# Altium footprint library 1MaxPcb.PcbLib: 187 footprints (part 1 of 12)
Each footprint in its own frame and in the unit in brackets; x right, y up, seen from the top. Pads: shape width x height; smd on the part's side, far side on the other; paste and mask are expansions set on the pad; w line width, h text height; cw(c..) or ccw(c..) is an arc to the next point about the centre after c.
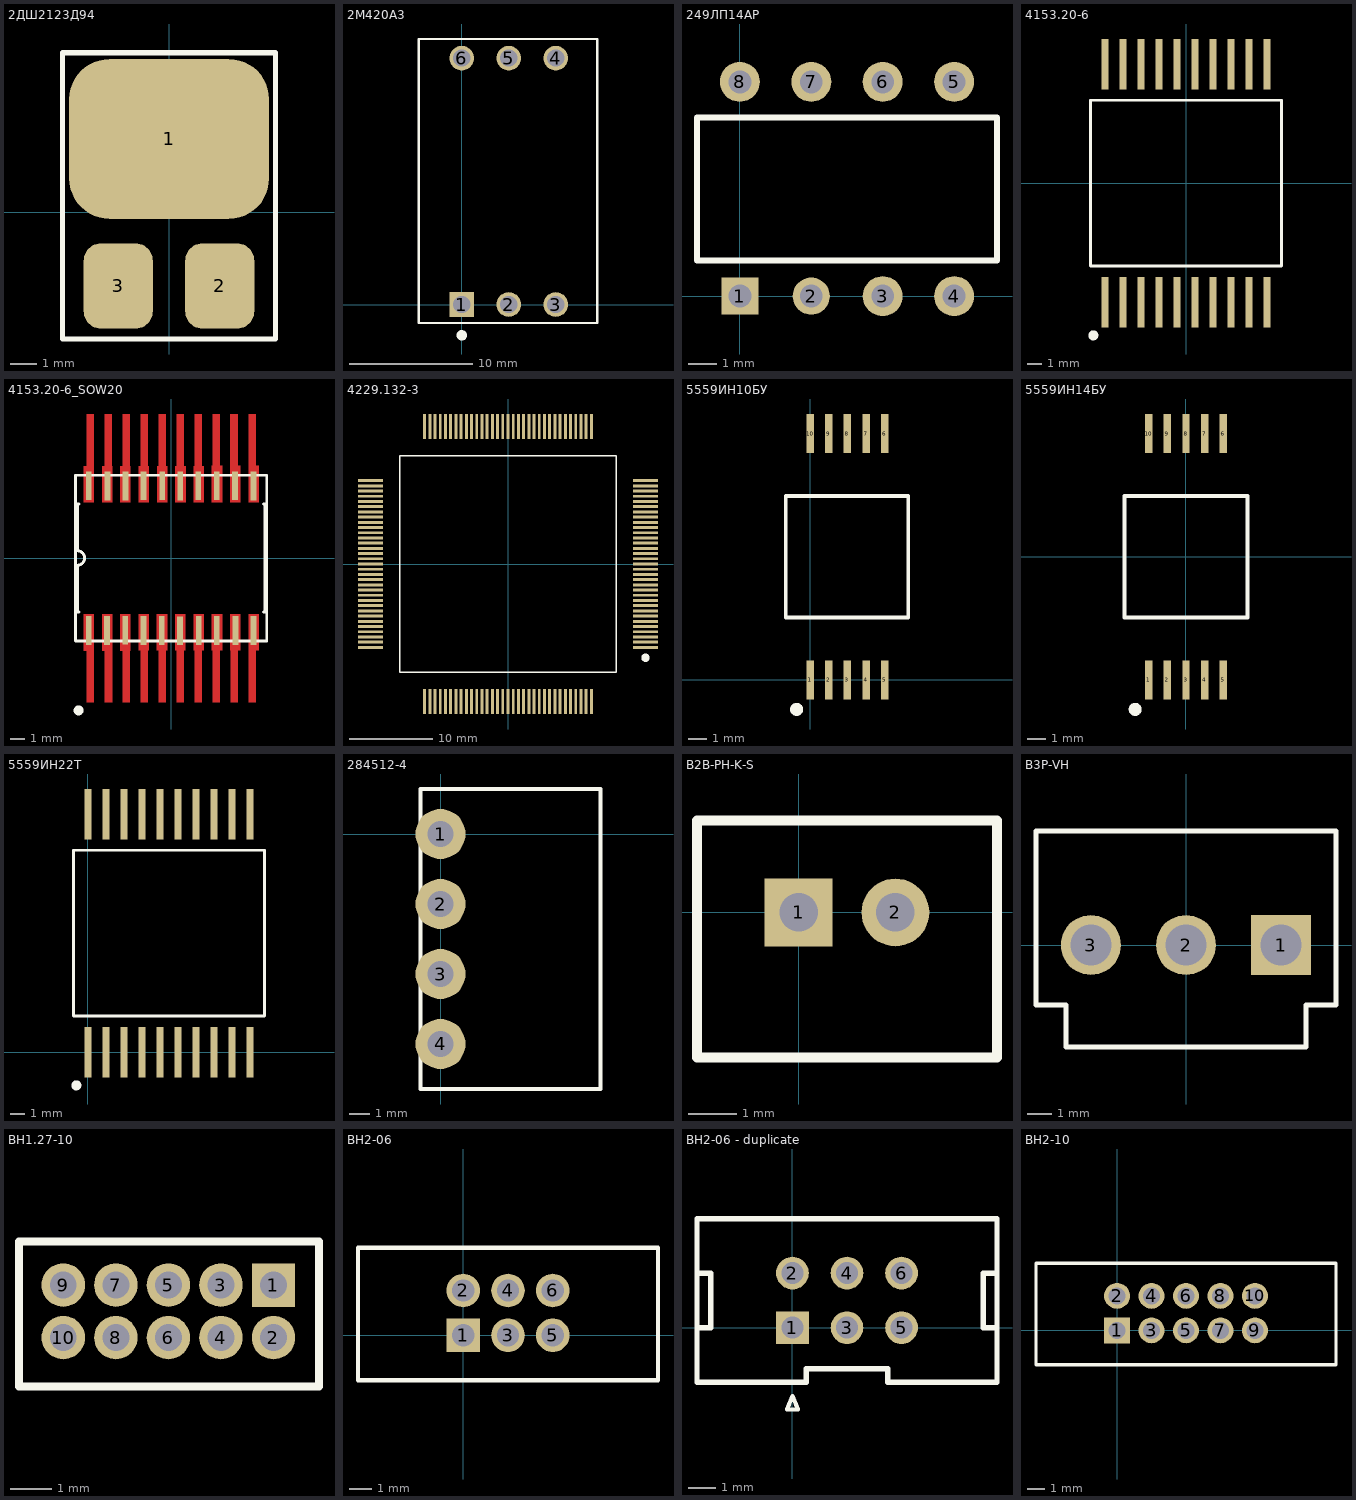
[diagram p0: the footprints below, top view; thin cyan lines are the x and y axes]

## 2ДШ2123Д94 [mm] "Диод Шоттки"
pads (3):
  rrect50% 7.5x6 smd: 1(0.005,2.76)
  rrect50% 2.6x3.2 smd: 2(1.905,-2.76) 3(-1.905,-2.76)
Top Overlay:
  lines w0.2: -4,-4.75 -4,6 4,6 4,-4.75 -4,-4.75
3D body "User Library-IR_SMD_0_5.STEP": height 3.1, standoff -0.02, extent -3.765,-4.44 3.755,5.72

## 2М420А3 [mm] "Герметичное МОП-реле 90В/5А"
pads (6):
  rect 2x2 hole 1.4: 1(0,0)
  round 2 hole 1.4: 2(3.81,0) 3(7.62,0) 4(7.62,20) 5(3.81,20) 6(0,20)
Top Overlay:
  circle w0.254: c0,-2.5 r0.3
  region: 0,-2.744 -0.051,-2.744 -0.144,-2.705 -0.215,-2.634 -0.254,-2.541 -0.254,-2.49 -0.254,-2.439 -0.215,-2.346 -0.144,-2.275 -0.051,-2.236 0,-2.236 0.051,-2.236 0.144,-2.275 0.215,-2.346 0.254,-2.439 0.254,-2.49 0.254,-2.541 0.215,-2.634 0.144,-2.705 0.051,-2.744
  lines w0.2: -3.5,-1.5 11,-1.5 11,21.55 -3.5,21.55 -3.5,-1.5
3D body "Оптореле 2М420А3.STEP": height 6.4, standoff -8.5, extent -3.05,-0.4 10.65,20.6

## 249ЛП14АР [mm] "многоканальные оптроны"
pads (8):
  rect 1.3x1.3 hole 0.8: 1(0,0)
  round 1.3 hole 0.8: 2(2.5,0)
  round 1.4 hole 0.8: 3(5,0) 4(7.5,0) 5(7.5,7.5) 6(5,7.5) 7(2.5,7.5) 8(0,7.5)
Top Overlay:
  lines w0.2: -1.5,1.25 -1.5,6.25 9,6.25 9,1.25 -1.5,1.25
3D body "User Library-2101_8-7.STEP": height 4.9, standoff -2.3, extent -1.25,-0.16 8.75,7.66

## 4153.20-6 [mm] "Регистр сдвига"
pads (20):
  rect 0.5x3.5 smd: 1(-5.625,-8.25) 2(-4.375,-8.25) 3(-3.125,-8.25) 4(-1.875,-8.25) 5(-0.625,-8.25) 6(0.625,-8.25) 7(1.875,-8.25) 8(3.125,-8.25) 9(4.375,-8.25) 10(5.625,-8.25) 11(5.625,8.25) 12(4.375,8.25) 13(3.125,8.25) 14(1.875,8.25) 15(0.625,8.25) 16(-0.625,8.25) 17(-1.875,8.25) 18(-3.125,8.25) 19(-4.375,8.25) 20(-5.625,8.25)
Top Overlay:
  circle w0.2: c-6.425,-10.55 r0.25
  rectangle: -6.625,-10.775 -6.225,-10.325
  lines w0.2: -6.625,-5.75 -6.625,5.75 6.625,5.75 6.625,-5.75 -6.625,-5.75
3D body "User Library-4153_20-6.STEP": height 3.04, standoff 0, extent -6.5,-8.8 6.5,8.7

## 4153.20-6_SOW20 [mm] "Регистр сдвига"
pads (20):
  rect 0.4x2 smd: 1(-5.725,-5) 2(-4.45,-5) 3(-3.195,-4.996) 4(-1.925,-5) 5(-0.65,-5) 6(0.6,-5.025) 7(1.9,-5) 8(3.15,-5) 9(4.45,-5) 10(5.7,-5) 11(5.7,5) 12(4.425,5.025) 13(3.15,5.025) 14(1.875,5.025) 15(0.625,5) 16(-0.625,5.025) 17(-1.925,5.025) 18(-3.175,5) 19(-4.425,5) 20(-5.725,5.025)
Top Layer:
  region: 4.1,-6.375 4.1,-3.875 4.8,-3.875 4.8,-6.375 4.625,-6.375 4.625,-10 4.125,-10 4.125,-6.375
  region: -1,-6.375 -1,-3.875 -0.275,-3.875 -0.275,-6.375 -0.375,-6.375 -0.375,-10 -0.875,-10 -0.875,-6.375
  region: -6.075,-6.4 -6.075,-3.875 -5.375,-3.875 -5.375,-10 -5.875,-10 -5.875,-6.4
  region: -4.8,-6.4 -4.8,-3.875 -4.1,-3.875 -4.1,-10 -4.625,-10 -4.625,-6.4
  region: -3.525,-6.4 -3.525,-3.875 -2.825,-3.875 -2.825,-6.4 -2.875,-6.4 -2.875,-10 -3.375,-10 -3.375,-6.4
  region: -2.25,-6.375 -2.125,-6.375 -2.125,-10 -1.625,-10 -1.625,-6.375 -1.55,-6.375 -1.55,-3.875 -2.25,-3.875
  region: 0.275,-6.375 0.275,-3.875 0.975,-3.875 0.975,-6.375 0.875,-6.375 0.875,-10 0.375,-10 0.375,-6.375
  region: 1.55,-6.375 1.625,-6.375 1.625,-10 2.125,-10 2.125,-6.375 2.25,-6.375 2.25,-3.875 1.55,-3.875
  region: 2.825,-6.375 2.825,-3.875 3.525,-3.875 3.525,-6.375 3.375,-6.375 3.375,-10 2.875,-10 2.875,-6.375
  region: 5.375,-10 5.875,-10 5.875,-6.375 6.075,-6.375 6.075,-3.875 5.375,-3.875
  region: -4.1,6.375 -4.1,3.875 -4.8,3.875 -4.8,6.375 -4.625,6.375 -4.625,10 -4.125,10 -4.125,6.375
  region: 1,6.375 1,3.875 0.275,3.875 0.275,6.375 0.375,6.375 0.375,10 0.875,10 0.875,6.375
  region: 6.075,6.4 6.075,3.875 5.375,3.875 5.375,10 5.875,10 5.875,6.4
  region: 4.8,6.4 4.8,3.875 4.1,3.875 4.1,10 4.625,10 4.625,6.4
  region: 3.525,6.4 3.525,3.875 2.825,3.875 2.825,6.4 2.875,6.4 2.875,10 3.375,10 3.375,6.4
  region: 2.25,6.375 2.125,6.375 2.125,10 1.625,10 1.625,6.375 1.55,6.375 1.55,3.875 2.25,3.875
  region: -0.275,6.375 -0.275,3.875 -0.975,3.875 -0.975,6.375 -0.875,6.375 -0.875,10 -0.375,10 -0.375,6.375
  region: -1.55,6.375 -1.625,6.375 -1.625,10 -2.125,10 -2.125,6.375 -2.25,6.375 -2.25,3.875 -1.55,3.875
  region: -2.825,6.375 -2.825,3.875 -3.525,3.875 -3.525,6.375 -3.375,6.375 -3.375,10 -2.875,10 -2.875,6.375
  region: -5.375,10 -5.875,10 -5.875,6.375 -6.075,6.375 -6.075,3.875 -5.375,3.875
Top Overlay:
  circle w0.2: c-6.425,-10.55 r0.25
  rectangle: -6.625,-10.775 -6.225,-10.325
  lines w0.2: -6.401,-3.734 -6.511,-3.734 -6.511,-0.484 ccw(c-6.511,0.016) -6.511,0.516 -6.511,3.766 -6.401,3.766 ; 6.399,-3.734 6.509,-3.734 6.509,3.766 6.399,3.766 ; -6.625,-5.75 6.625,-5.75 6.625,5.75 -6.625,5.75 -6.625,-5.75
3D body "User Library-4153_20-6.STEP": height 3.04, standoff 0, extent -6.425,-8.9 6.575,8.6

## 4229.132-3 [mm]
pads (132):
  rect 3x0.35 smd paste+0: 1(16.5,-10) 2(16.5,-9.375) 3(16.5,-8.75) 4(16.5,-8.125) 5(16.5,-7.5) 6(16.5,-6.875) 7(16.5,-6.25) 8(16.5,-5.625) 9(16.5,-5) 10(16.5,-4.375) 11(16.5,-3.75) 12(16.5,-3.125) 13(16.5,-2.5) 14(16.5,-1.875) 15(16.5,-1.25) 16(16.5,-0.625) 17(16.5,0) 18(16.5,0.625) 19(16.5,1.25) 20(16.5,1.875) 21(16.5,2.5) 22(16.5,3.125) 23(16.5,3.75) 24(16.5,4.375) 25(16.5,5) 26(16.5,5.625) 27(16.5,6.25) 28(16.5,6.875) 29(16.5,7.5) 30(16.5,8.125) 31(16.5,8.75) 32(16.5,9.375) 33(16.5,10) 67(-16.5,10) 68(-16.5,9.375) 69(-16.5,8.75) 70(-16.5,8.125) 71(-16.5,7.5) 72(-16.5,6.875) 73(-16.5,6.25) 74(-16.5,5.625) 75(-16.5,5) 76(-16.5,4.375) 77(-16.5,3.75) 78(-16.5,3.125) 79(-16.5,2.5) 80(-16.5,1.875) 81(-16.5,1.25) 82(-16.5,0.625) 83(-16.5,0) 84(-16.5,-0.625) 85(-16.5,-1.25) 86(-16.5,-1.875) 87(-16.5,-2.5) 88(-16.5,-3.125) 89(-16.5,-3.75) 90(-16.5,-4.375) 91(-16.5,-5) 92(-16.5,-5.625) 93(-16.5,-6.25) 94(-16.5,-6.875) 95(-16.5,-7.5) 96(-16.5,-8.125) 97(-16.5,-8.75) 98(-16.5,-9.375) 99(-16.5,-10)
  rect 0.35x3 smd paste+0: 34(10,16.5) 35(9.375,16.5) 36(8.75,16.5) 37(8.125,16.5) 38(7.5,16.5) 39(6.875,16.5) 40(6.25,16.5) 41(5.625,16.5) 42(5,16.5) 43(4.375,16.5) 44(3.75,16.5) 45(3.125,16.5) 46(2.5,16.5) 47(1.875,16.5) 48(1.25,16.5) 49(0.625,16.5) 50(0,16.5) 51(-0.625,16.5) 52(-1.25,16.5) 53(-1.875,16.5) 54(-2.5,16.5) 55(-3.125,16.5) 56(-3.75,16.5) 57(-4.375,16.5) 58(-5,16.5) 59(-5.625,16.5) 60(-6.25,16.5) 61(-6.875,16.5) 62(-7.5,16.5) 63(-8.125,16.5) 64(-8.75,16.5) 65(-9.375,16.5) 66(-10,16.5) 100(-10,-16.5) 101(-9.375,-16.5) 102(-8.75,-16.5) 103(-8.125,-16.5) 104(-7.5,-16.5) 105(-6.875,-16.5) 106(-6.25,-16.5) 107(-5.625,-16.5) 108(-5,-16.5) 109(-4.375,-16.5) 110(-3.75,-16.5) 111(-3.125,-16.5) 112(-2.5,-16.5) 113(-1.875,-16.5) 114(-1.25,-16.5) 115(-0.625,-16.5) 116(0,-16.5) 117(0.625,-16.5) 118(1.25,-16.5) 119(1.875,-16.5) 120(2.5,-16.5) 121(3.125,-16.5) 122(3.75,-16.5) 123(4.375,-16.5) 124(5,-16.5) 125(5.625,-16.5) 126(6.25,-16.5) 127(6.875,-16.5) 128(7.5,-16.5) 129(8.125,-16.5) 130(8.75,-16.5) 131(9.375,-16.5) 132(10,-16.5)
Top Overlay:
  circle w0.5: c16.5,-11.245 r0.25
  lines w0.2: -13,-13 -13,13 13,13 13,-13 -13,-13
3D body "Миландр. STEP-модель для корпуса 4229.132-3 формованный.STEP": height 3.63, standoff -0.02, extent -17.1,-17.1 17.1,17.1

## 5559ИН10БУ [mm]
pads (10):
  rect 0.4x2.1 smd: 1(0,0) 2(1,0) 3(2,0) 4(3,0) 5(4,0) 6(4,13.2) 7(3,13.2) 8(2,13.2) 9(1,13.2) 10(0,13.2)
Top Overlay:
  circle w0.2: c-0.725,-1.575 r0.25
  region: -0.725,-1.825 -0.975,-1.575 -0.725,-1.325 -0.475,-1.575
  lines w0.2: -1.3,3.35 5.25,3.35 5.25,9.85 -1.3,9.85 -1.3,3.35
3D body "Н02.8-1В1.STEP": height 2.9, standoff 0, extent -1.25,-0.9 5.25,14.1

## 5559ИН14БУ [mm]
pads (10):
  rect 0.4x2.1 smd: 1(-2,-6.6) 2(-1,-6.6) 3(0,-6.6) 4(1,-6.6) 5(2,-6.6) 6(2,6.6) 7(1,6.6) 8(0,6.6) 9(-1,6.6) 10(-2,6.6)
Top Overlay:
  circle w0.2: c-2.725,-8.175 r0.25
  region: -2.725,-8.425 -2.975,-8.175 -2.725,-7.925 -2.475,-8.175
  lines w0.2: -3.3,-3.25 3.3,-3.25 3.3,3.25 -3.3,3.25 -3.3,-3.25
3D body "Н02.8-1В1.STEP": height 2.9, standoff 0, extent -3.25,-7.5 3.25,7.5

## 5559ИН22Т [mm] "Автономный CAN - контроллер"
pads (20):
  rect 0.5x3.5 smd: 1(0,0) 2(1.25,0) 3(2.5,0) 4(3.75,0) 5(5,0) 6(6.25,0) 7(7.5,0) 8(8.75,0) 9(10,0) 10(11.25,0) 11(11.25,16.5) 12(10,16.5) 13(8.75,16.5) 14(7.5,16.5) 15(6.25,16.5) 16(5,16.5) 17(3.75,16.5) 18(2.5,16.5) 19(1.25,16.5) 20(0,16.5)
Top Overlay:
  circle w0.2: c-0.8,-2.3 r0.25
  rectangle: -1,-2.525 -0.6,-2.075
  lines w0.2: -1,2.5 12.25,2.5 12.25,14 -1,14 -1,2.5
3D body "User Library-4153_20-6.STEP": height 3.04, standoff 0, extent -0.875,-0.55 12.125,16.95

## 284512-4 [mm]
pads (4):
  round 2.5 hole 1.3: 1(0,0) 2(0,-3.5) 3(0,-7) 4(0,-10.5)
Top Overlay:
  lines w0.2: -1,-12.75 8,-12.75 8,2.25 -1,2.25 -1,-12.75
3D body "c-284512-4-e1-3d.stp": height 7.75, standoff -2.9, extent -1.25,-13.275 7.95,2.725

## B2B-PH-K-S [mm]
pads (2):
  rect 1.4x1.4 hole 0.8: 1(0,0)
  round 1.4 hole 0.8: 2(2,0)
Top Overlay:
  lines w0.2: -2.1,-3 -2.1,1.9 4.1,1.9 4.1,-3 -2.1,-3
3D body "B2B-PH-K-S.STEP": height 6, standoff -3.4, extent -1.95,-2.8 3.95,1.7

## B3P-VH [mm]
height 12.25
pads (3):
  rect 2.5x2.5 hole 1.7: 1(3.96,0)
  round 2.5 hole 1.7: 2(0,0) 3(-3.96,0)
Top Overlay:
  lines w0.2: -6.25,-2.5 -5,-2.5 -5,-4.25 5,-4.25 5,-2.75 5,-2.5 6.25,-2.5 6.25,4.75 -6.25,4.75 -6.25,-2.5
3D body "User Library-B3P-VH.STEP": height 10.9, standoff -3.7, extent -5.91,-3.95 5.91,4.55

## BH1.27-10 [mm]
height 5.26
pads (10):
  rect 1.05x1.05 hole 0.65 mask+0.05: 1(-4.1,5.7)
  round 1.05 hole 0.65 mask+0.05: 2(-4.1,4.43) 3(-5.37,5.7) 4(-5.37,4.43) 5(-6.64,5.7) 6(-6.64,4.43) 7(-7.91,5.7) 8(-7.91,4.43) 9(-9.18,5.7) 10(-9.18,4.43)
Top Overlay:
  lines w0.2: -10.25,3.25 -3,3.25 -3,6.75 -10.25,6.75 -10.25,3.25

## BH2-06 [mm]
pads (6):
  rect 1.5x1.5 hole 1: 1(0,0)
  round 1.5 hole 1: 2(0,2) 3(2,0) 4(2,2) 5(4,0) 6(4,2)
Top Overlay:
  lines w0.2: -4.7,-2 8.7,-2 8.7,3.9 -4.7,3.9 -4.7,-2
3D body "Вилка _ ВН2-6.stp": height 5.7, standoff -3.6, extent -4.6,-1.8 8.6,3.8

## BH2-06 - duplicate [mm]
pads (6):
  rect 1.2x1.2 hole 0.8: 1(0,0)
  round 1.2 hole 0.8: 2(0,2) 3(2,0) 4(2,2) 5(4,0) 6(4,2)
Top Overlay:
  lines w0.15: -0.2,-3 0.2,-3 0,-2.5 -0.2,-3
  lines w0.2: -3.5,0 -3,0 -3,2 -3.5,2 ; 7.5,0 7,0 7,2 7.5,2 ; -3.5,-2 0.5,-2 0.5,-1.5 3.5,-1.5 3.5,-2 7.5,-2 7.5,4 -3.5,4 -3.5,-2

## BH2-10 [mm]
pads (10):
  rect 1.5x1.5 hole 1: 1(0,0)
  round 1.5 hole 1: 2(0,2) 3(2,0) 4(2,2) 5(4,0) 6(4,2) 7(6,0) 8(6,2) 9(8,0) 10(8,2)
Top Overlay:
  lines w0.2: -4.7,-2 -4.7,3.9 12.7,3.9 12.7,-2 -4.7,-2
3D body "User Library-IDC2-10.STEP": height 5.6, standoff -3.6, extent -4.55,-1.8 12.55,3.7